# Altium footprint library LituLib.PcbLib: 69 footprints (part 5 of 5)
Each footprint in its own frame and in the unit in brackets; x right, y up, seen from the top. Pads: shape width x height; smd on the part's side, far side on the other; paste and mask are expansions set on the pad; w line width, h text height; cw(c..) or ccw(c..) is an arc to the next point about the centre after c.
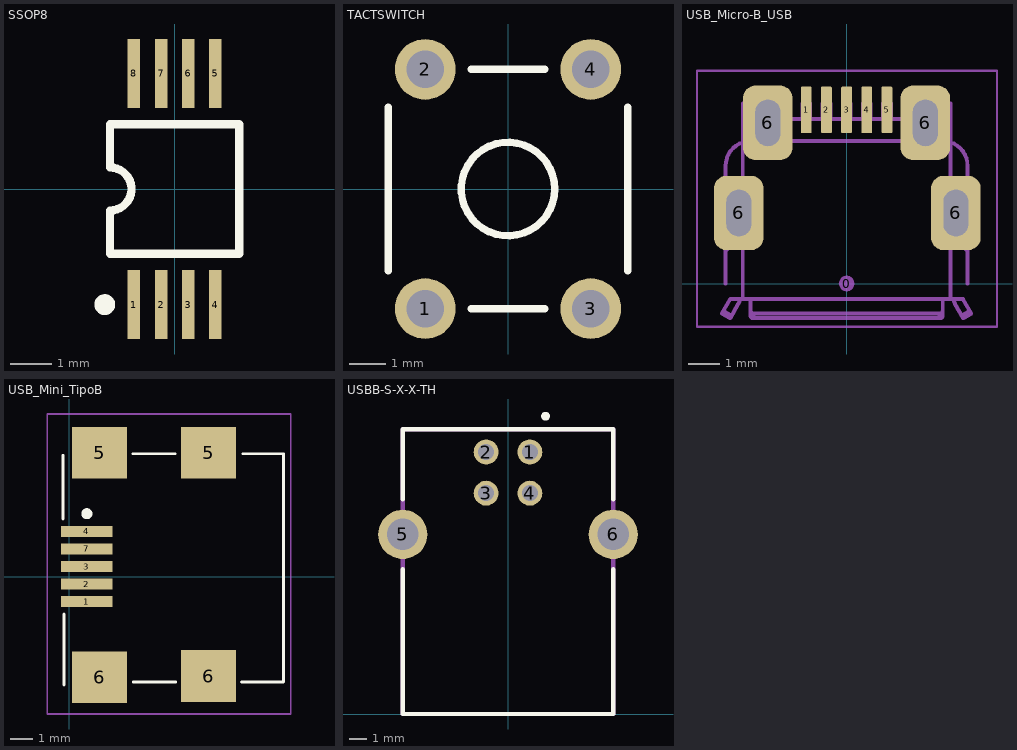
[diagram p4: the footprints below, top view; thin cyan lines are the x and y axes]

## SSOP8 [mm] "SSOP, Plastic; 8 Leads; Body Width 5.3 mm; Pitch 0.65 mm"
height 2
pads (8):
  rect 0.3x1.65 smd: 1(-0.975,-2.775) 2(-0.325,-2.775) 3(0.325,-2.775) 4(0.975,-2.775) 5(0.975,2.775) 6(0.325,2.775) 7(-0.325,2.775) 8(-0.975,2.775)
Top Overlay:
  circle w0.25: c-1.675,-2.775 r0.125
  lines w0.2: -1.55,-1.55 -1.55,-0.517 ccw(c-1.55,0) -1.55,0.517 -1.55,1.55 1.55,1.55 1.55,-1.55 -1.55,-1.55
3D body "User Library-SSOP-8-1.step": height 1.33, standoff 0.03, extent -1.575,-2.125 1.575,2.125

## TACTSWITCH [mil]
pads (4):
  round 65 hole 40: 1(-88.58,-127.95) 2(-88.58,127.95) 3(88.58,-127.95) 4(88.58,127.95)
Top Overlay:
  circle w7.87: c0,0 r50
  lines w7.87: -128.11,-87.48 -128.11,87.52 ; -39.37,-128.11 39.37,-128.11 ; -39.37,128.11 39.37,128.11 ; 128.11,-87.52 128.11,87.48
3D body "TACTSWITCH.step": height 275.59, standoff -137.8, extent -120,-155.51 124.09,155.51

## USB_Micro-B_USB [mm]
height 2.286
pads (10):
  round 0.508 on Mech15: 0(0,0)
  rrect20% 0.35x1.5 smd: 1(-1.3,5.6) 2(-0.65,5.6) 3(0,5.6) 4(0.65,5.6) 5(1.3,5.6)
  rrect50% 1.6x2.4 hole 0.8 slot 1.5 at 90 deg: 6(-3.475,2.275) 6(-2.54,5.182) 6(2.54,5.182) 6(3.525,2.275)
Top Solder:
  region: 1.905,4.826 1.905,6.35 -1.905,6.35 -1.905,4.826
Mechanical 13:
  lines w0.127: -3.97,-0.881 -3.71,-1.031 ; -3.85,1.1 -3.85,2.1 ; -3.45,-0.5 cw(c-3.75,-0.501) -3.49,-0.651 -3.76,-1.118 -4.02,-0.968 -3.75,-0.5 -3.1,-0.5 ; -3.35,-0.5 -3.35,5.8 ; -3.1,-0.881 ccw(c-3.006,-0.874) -3,-0.968 ; -2.577,5.8 cw(c-2.577,5.6) -2.443,5.748 -2.007,5.352 ccw(c-1.873,5.5) -1.873,5.3 1.873,5.3 ccw(c1.873,5.5) 2.007,5.352 2.443,5.748 cw(c2.577,5.6) 2.577,5.8 ; -2.526,5.793 -2.526,5.8 ; -2.229,5.553 ccw(c-2.275,5.8) -2.024,5.8 -1.825,5.8 -1.825,5.3 ; -1.425,5.3 -1.425,5.8 -1.175,5.8 -1.175,5.3 ; -0.775,5.3 -0.775,5.8 -0.525,5.8 -0.525,5.3 ; -0.125,5.3 -0.125,5.8 0.125,5.8 0.125,5.3 ; 0.525,5.3 0.525,5.8 0.775,5.8 0.775,5.3 ; 1.175,5.3 1.175,5.8 1.425,5.8 1.425,5.3 ; 1.825,5.3 1.825,5.8 2.024,5.8 ccw(c2.275,5.8) 2.229,5.553 ; 2.526,5.793 2.526,5.8 ; 3.1,-0.881 cw(c3.006,-0.874) 3,-0.968 ; 3.35,-0.5 3.35,5.8 ; 3.45,-0.5 ccw(c3.75,-0.501) 3.49,-0.651 3.76,-1.118 4.02,-0.968 3.75,-0.5 3.1,-0.5 ; 3.71,-1.031 3.97,-0.881 ; 3.85,1.1 3.85,2.1 ; -3.1,-0.5 3.1,-0.501 ; -3.1,-0.5 -3.1,-1.031 ccw(c-3.006,-1.024) -3,-1.118 ; -3,-1.118 3,-1.118 ; -3,-1.118 -3,-0.968 ; -3,-0.968 3,-0.968 ; 3,-1.118 ccw(c3.006,-1.024) 3.1,-1.031 3.1,-0.5 ; 3,-1.118 3,-0.968
Mechanical 15:
  lines w0.076: -4.825,-1.397 -4.825,6.858 4.85,6.858 4.85,-1.397 -4.825,-1.397
  lines w0.127: -3.9,0 -3.9,3.797 cw(c-3.1,3.797) -3.1,4.597 3.1,4.597 cw(c3.1,3.797) 3.9,3.797 3.9,0
3D body "K3D-DX4R005JJ2-V3_JAE_Proprietary.STEP": height 2.7, standoff -0.63, extent -4.02,-0.3 4.02,5.3

## USB_Mini_TipoB [mm] "USB MINI SMD TIPO B"
pads (9):
  rect 2.35x0.5 smd: 1(0.811,-1.143) 2(0.811,-0.343) 3(0.811,0.457) 4(0.812,2.057) 7(0.811,1.257)
  rect 2.5x2.35 smd: 5(1.397,5.632) 5(6.35,5.632) 6(1.397,-4.572) 6(6.35,-4.521)
Top Overlay:
  circle w0.25: c0.811,2.857 r0.125
  lines w0.128: -0.279,2.616 -0.279,5.512 ; -0.229,-4.928 -0.229,-1.702 ; 2.896,5.588 4.826,5.588 ; 2.921,-4.801 4.851,-4.801 ; 7.849,-4.801 9.754,-4.801 9.754,5.588 7.899,5.588
Mechanical 15:
  lines w0.076: -0.991,-6.248 10.084,-6.248 10.084,7.391 -0.991,7.391 -0.991,-6.248
3D body "c-1734035-1-e-3d.stp": height 4.17, standoff -0.92, extent 0.254,-4.493 9.454,5.407

## USBB-S-X-X-TH [mm]
pads (6):
  round 1.428 / inner round 1.524 / far side round 1.524 hole 0.92 mask+0.076: 1(1.25,14.99) 2(-1.25,14.99) 3(-1.25,12.635) 4(1.25,12.635)
  round 2.819 / inner round 1.524 / far side round 1.524 hole 1.8 mask+0.076: 5(-6.02,10.28) 6(6.02,10.28)
Top Overlay:
  circle w0.254: c2.148,17.04 r0.127
  lines w0.254: -6.02,8.28 -6.02,0 6.02,0 6.02,8.28 ; -6.02,12.28 -6.02,16.3 6.02,16.3 6.02,12.28
Mechanical 1:
  lines w0.254: -6.02,1.98 -6.02,16.14 ; 6.02,1.98 6.02,16.14 ; -6.02,0 -6.02,16.3 6.02,16.3 6.02,0 -6.02,0
3D body "User Library-67068-0000-molex.step": height 11, standoff -4.42, extent -7.493,-0.372 7.391,16.628